# Altium footprint library 2.52-直插元件.PcbLib: 467 footprints (part 18 of 30)
Each footprint in its own frame and in the unit in brackets; x right, y up, seen from the top. Pads: shape width x height; smd on the part's side, far side on the other; paste and mask are expansions set on the pad; w line width, h text height; cw(c..) or ccw(c..) is an arc to the next point about the centre after c.
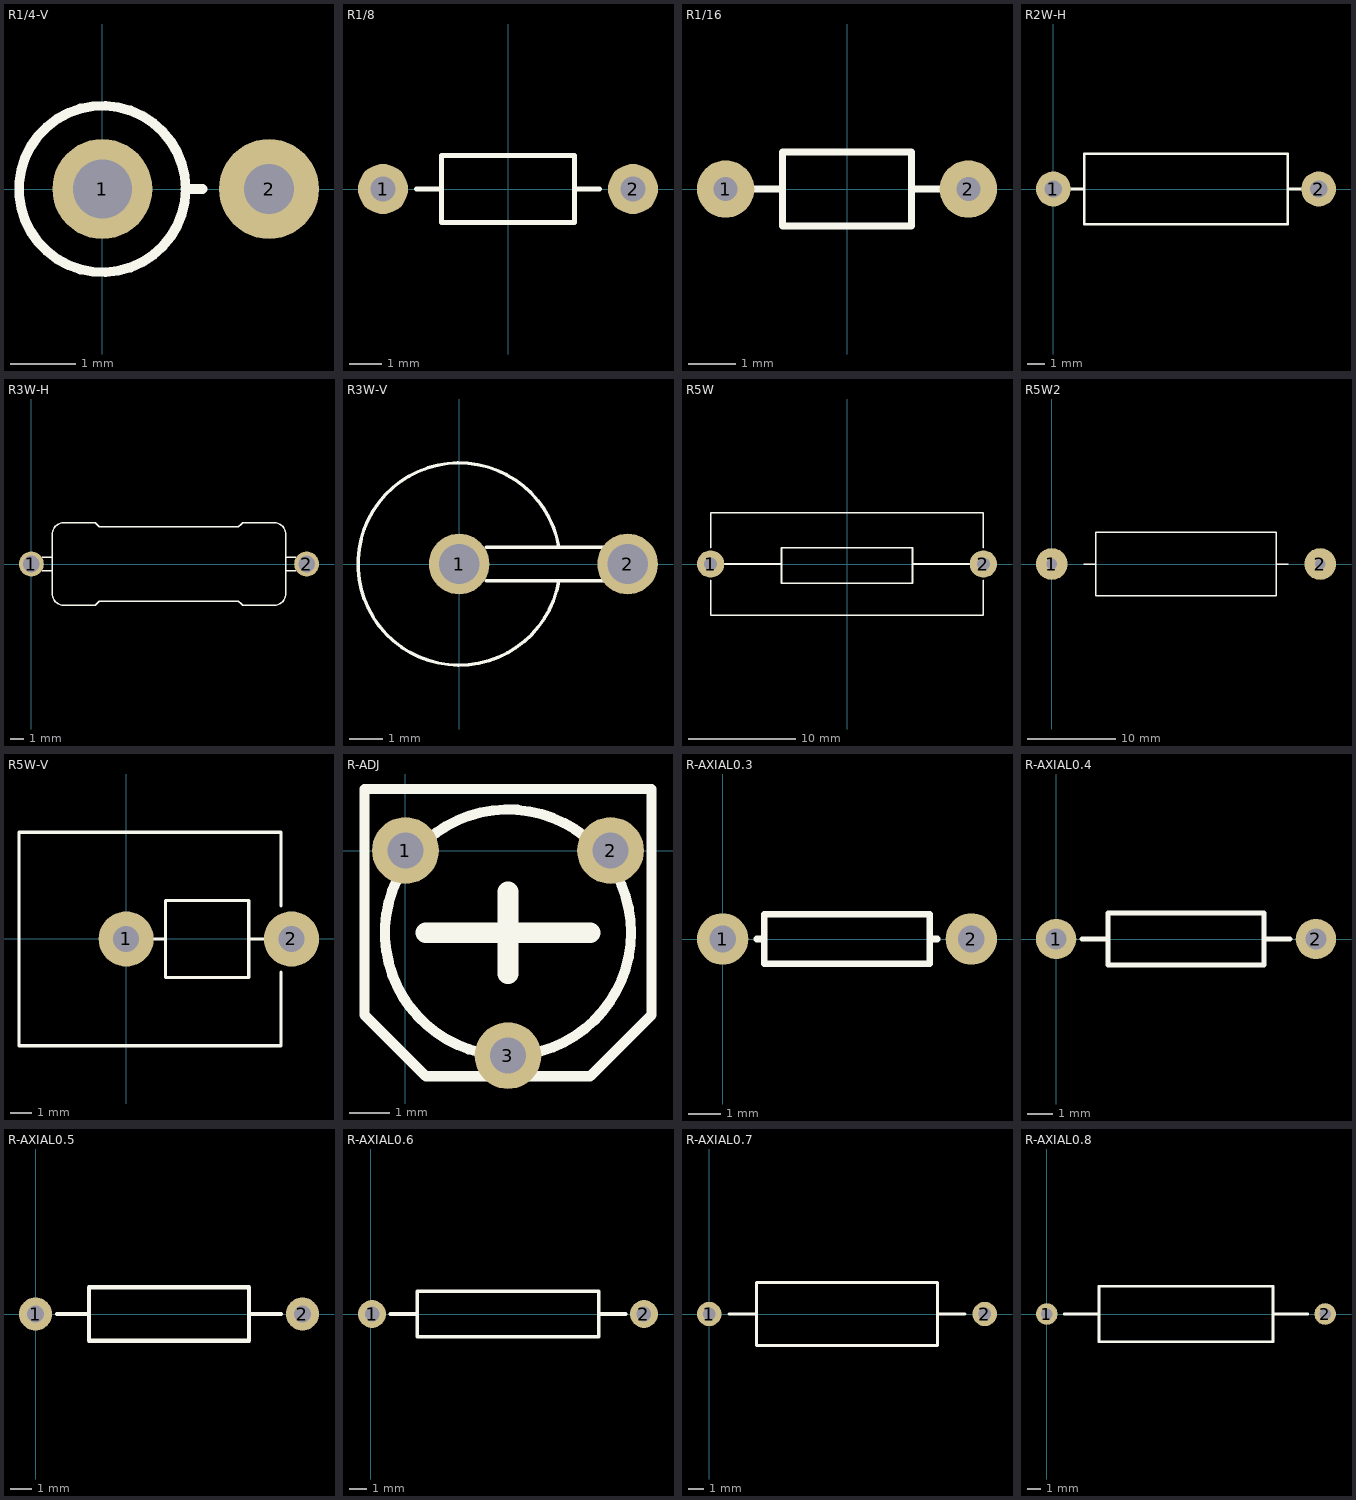
[diagram p17: the footprints below, top view; thin cyan lines are the x and y axes]

## R1/4-V [mil] "淘宝ID:黄晶宝石   店铺网址:https://shop463601444.taobao.com"
pads (2):
  round 60 hole 35.43: 1(0,0)
  round 60 hole 30: 2(100,0)
Top Overlay:
  circle w5.91: c0,0 r50
  lines w5.91: 50,0 60,0
3D body "User Library-Res_Stand.STEP": height 296.06, standoff -59.06, extent -36.3,-36.23 109.85,36.24

## R1/8 [mil]
pads (2):
  round 60 hole 30: 1(-150,0) 2(150,0)
Top Overlay:
  lines w5.91: -110,0 -80,0 ; 80,0 110,0 ; -80,-40 80,-40 80,40 -80,40 -80,-40
3D body "User Library-Resistencia-1.step": height 98.92, standoff -39.37, extent -160,-38.24 160,38.24

## R1/16 [mm]
pads (2):
  round 1.2 hole 0.5: 1(-2.54,0) 2(2.54,0)
Top Overlay:
  lines w0.15: -2.111,0 -1.349,0 ; 1.349,0 2.111,0 ; -1.347,-0.771 1.347,-0.771 1.347,0.774 -1.347,0.774 -1.347,-0.771
3D body "User Library-Resistencia-2.step": height 2.39, standoff -1, extent -2.794,-0.848 2.794,0.848

## R2W-H [mm]
pads (2):
  round 2 hole 1: 1(0,0) 2(15.24,0)
Top Overlay:
  lines w0.15: 0,0 1.778,0 ; 13.462,0 15.24,0 ; 1.778,-2.032 13.462,-2.032 13.462,2.032 1.778,2.032 1.778,-2.032
3D body "User Library-5083NW20K00J12AFX-2.STEP": height 4.39, standoff -1.8, extent -0.4,-1.75 15.64,1.75

## R3W-H [mm]
pads (2):
  round 1.8 hole 1.2: 1(0,0) 2(20,0)
Top Overlay:
  lines w0.1: 0.8,-0.5 1.5,-0.5 ; 0.8,0.5 1.5,0.5 ; 4.58,3.001 cw(c4.58,2.848) 4.688,2.956 ; 4.643,-3.001 4.828,-2.816 4.908,-2.736 cw(c4.995,-2.823) 4.995,-2.7 14.995,-2.7 cw(c14.995,-2.823) 15.082,-2.736 15.162,-2.816 15.347,-3.001 ; 4.688,-2.956 cw(c4.58,-2.848) 4.58,-3.001 2.347,-3.001 cw(c2.369,-2.131) 1.499,-2.109 1.5,2.109 cw(c2.369,2.131) 2.347,3.001 4.643,3.001 4.828,2.816 4.908,2.736 ccw(c4.995,2.823) 4.995,2.7 14.995,2.7 ccw(c14.995,2.823) 15.082,2.736 15.162,2.816 15.347,3.001 ; 15.302,-2.956 ccw(c15.41,-2.848) 15.41,-3.001 17.651,-3.001 ; 15.302,2.956 cw(c15.41,2.848) 15.41,3.001 15.41,3 17.652,3 cw(c17.63,2.131) 18.5,2.109 18.5,-2.109 cw(c17.63,-2.131) 17.652,-3 ; 18.5,-0.5 19.2,-0.5 ; 18.5,0.5 19.2,0.5
3D body "User Library-AXIAL_RESISTOR(3W).step": height 12.3, standoff -2, extent -0.605,-3.3 20.595,3.3

## R3W-V [mm]
pads (2):
  round 1.8 hole 1.2: 1(0,0) 2(5,0)
Top Overlay:
  lines w0.1: 0.8,0.5 4.3,0.5 ; 0.805,-0.5 4.3,-0.5 ; 2.955,0.521 ccw(c0,0) 2.958,-0.503
3D body "User Library-AXIAL_RESISTOR(3W_VERT).STEP": height 23.3, standoff -3.1, extent -3.302,-3.3 5.598,3.3

## R5W [mm] "淘宝ID:黄晶宝石   店铺网址:https://shop463601444.taobao.com"
pads (2):
  round 2.54 hole 1.2: 1(-12.7,0) 2(12.7,0)
Top Overlay:
  lines w0.15: -12.7,-1.524 -12.7,-4.776 12.7,-4.776 12.7,-1.524 ; -12.7,1.524 -12.7,4.776 12.7,4.776 12.7,1.524 ; -11.684,0 -6.096,0 ; 6.096,0 11.684,0 ; -6.096,-1.778 6.096,-1.778 6.096,1.524 0,1.524 -6.096,1.524 -6.096,-1.778
3D body "User Library-5W Resistor.step": height 9.21, standoff -2.5, extent -13.2,-4.85 13.2,4.85

## R5W2 [mm]
pads (2):
  round 3.6 hole 1.2: 1(0,0) 2(30.48,0)
Top Overlay:
  lines w0.15: 3.6,0 4.975,0 ; 26.88,0 25.505,0 ; 4.975,0 4.975,3.6 25.505,3.6 25.505,0 ; 4.975,0 4.975,-3.6 25.505,-3.6 25.505,0
3D body "User Library-5w wid.step": height 7.85, standoff -3.35, extent -0.4,-3.5 30.88,3.5

## R5W-V [mm]
pads (2):
  round 2.54 hole 1.2: 1(0,0) 2(7.62,0)
Top Overlay:
  lines w0.15: -4.941,1.524 -4.941,4.919 7.142,4.919 7.142,1.524 ; -4.941,1.566 -4.941,-4.919 7.142,-4.919 7.142,-1.524 ; 1.016,0 1.816,0 ; 5.648,0 6.794,0 ; 1.816,-1.778 1.816,1.778 5.648,1.778 5.648,-1.778 1.816,-1.778
3D body "User Library-5W Res.step": height 23.05, standoff -2.4, extent -5.016,-5 8.064,5

## R-ADJ [mil]
pads (3):
  round 65 hole 35: 1(0,0) 2(200,0) 3(100,-200)
Top Overlay:
  circle w10: c100,-80 r120
  lines w10: -40,-160 -40,60 240,60 240,-160 180,-220 20,-220 -40,-160
  lines w20: 20,-80 180,-80 ; 100,-120 100,-40

## R-AXIAL0.3 [mil]
pads (2):
  round 62 hole 32: 1(0,0) 2(300,0)
Top Overlay:
  lines w8: 41,0 50,0 ; 259,0 250,0 ; 250,0 250,30 50,30 50,-30 250,-30 250,0

## R-AXIAL0.4 [mil]
pads (2):
  round 62 hole 32: 1(0,0) 2(400,0)
Top Overlay:
  lines w8: 40,0 80,0 ; 320,0 360,0 ; 80,-40 320,-40 320,40 80,40 80,-40

## R-AXIAL0.5 [mil]
pads (2):
  round 62 hole 32: 1(0,0) 2(500,0)
Top Overlay:
  lines w8: 40,0 100,0 ; 400,0 460,0 ; 100,-50 100,50 400,50 400,-50 100,-50

## R-AXIAL0.6 [mil]
pads (2):
  round 62 hole 32: 1(2.5,0) 2(602.5,0)
Top Overlay:
  lines w8: 42.5,0 102.5,0 ; 502.5,0 562.5,0 ; 102.5,-50 102.5,50 502.5,50 502.5,-50 102.5,-50

## R-AXIAL0.7 [mil]
pads (2):
  round 62 hole 32: 1(0,0) 2(700,0)
Top Overlay:
  lines w8: 50,0 120,0 ; 580,0 650,0 ; 120,-80 120,80 580,80 580,-80 120,-80

## R-AXIAL0.8 [mil]
pads (2):
  round 62 hole 32: 1(0,0) 2(800,0)
Top Overlay:
  lines w8: 50,0 150,0 ; 650,0 750,0 ; 150,-80 150,80 650,80 650,-80 150,-80